# Altium footprint library pinghengche.PcbLib: 128 footprints (part 1 of 8)
Each footprint in its own frame and in the unit in brackets; x right, y up, seen from the top. Pads: shape width x height; smd on the part's side, far side on the other; paste and mask are expansions set on the pad; w line width, h text height; cw(c..) or ccw(c..) is an arc to the next point about the centre after c.
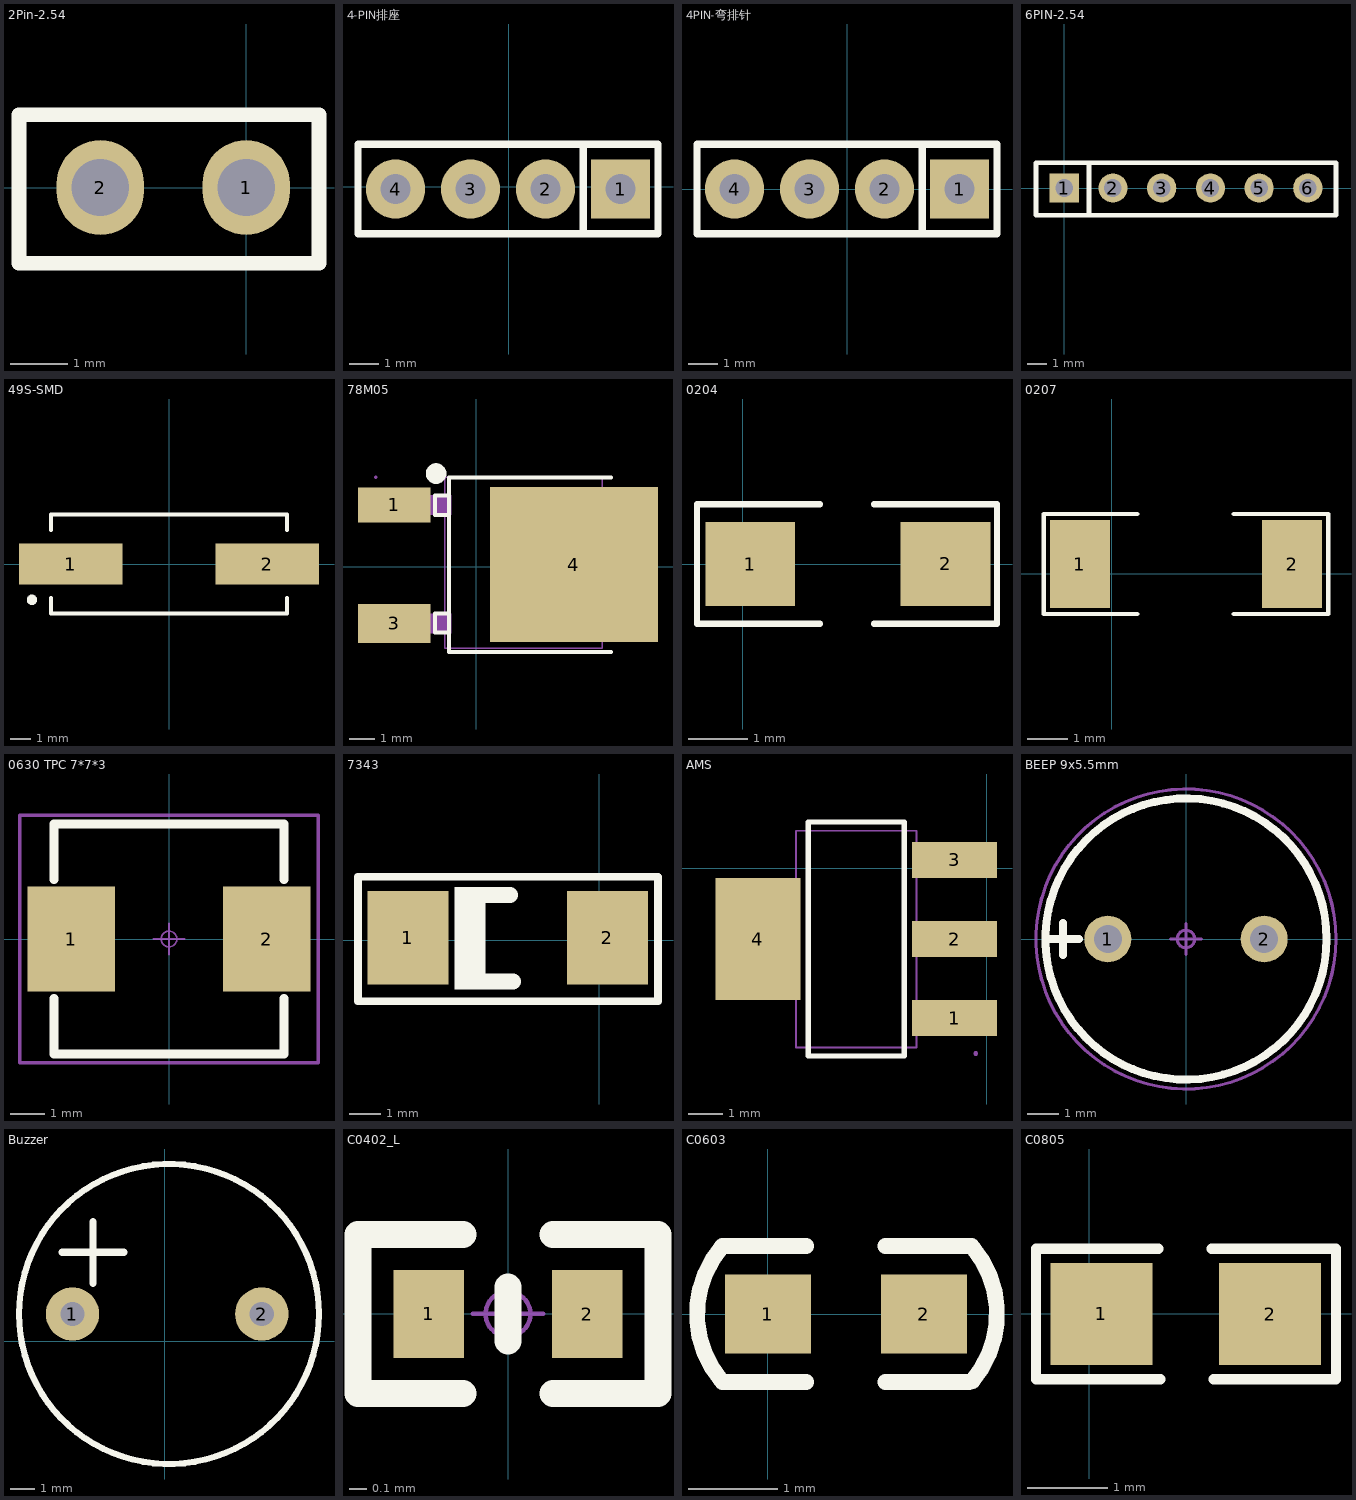
[diagram p0: the footprints below, top view; thin cyan lines are the x and y axes]

## 2Pin-2.54 [mil]
pads (2):
  oval 60x65 hole 39.37: 1(0,0) 2(-100.1,0)
Top Overlay:
  lines w10: -156,-52 50,-52 50,50 -156,50 -156,-52
3D body "1001-2.STEP": height 336.22, standoff -118.11, extent -153,-51 47,49

## 4-PIN排座 [mm]
pads (4):
  rect 2x2 hole 1: 1(3.785,-0.076)
  round 2 hole 1: 2(1.245,-0.076) 3(-1.295,-0.076) 4(-3.835,-0.076)
Top Overlay:
  lines w0.254: 2.515,-1.6 2.515,1.448 ; -5.105,-1.6 -5.105,1.448 5.055,1.448 5.055,-1.6 -5.105,-1.6
3D body "User Library-RM254_4pin.STEP": height 6.02, standoff -3.1, extent -5.131,-1.346 5.029,1.194

## 4PIN-弯排针 [mm] "弯排针"
pads (4):
  rect 2x2 hole 1: 1(3.81,0)
  round 2 hole 1: 2(1.27,0) 3(-1.27,0) 4(-3.81,0)
Top Overlay:
  lines w0.254: 2.54,-1.524 2.54,1.524 ; -5.08,-1.524 -5.08,1.524 5.08,1.524 5.08,-1.524 -5.08,-1.524
3D body "User Library-header90-4.STEP": height 3.04, standoff -2.5, extent -5.029,-10.004 5.131,0.356

## 6PIN-2.54 [mm]
pads (6):
  rect 1.5x1.5 hole 0.9: 1(0,0)
  round 1.5 hole 0.9: 2(2.5,0) 3(5,0) 4(7.5,0) 5(10,0) 6(12.5,0)
Top Overlay:
  lines w0.254: 1.27,-1.346 1.27,1.245 ; -1.448,-1.397 13.945,-1.397 13.945,1.295 -1.448,1.295 -1.448,-1.397
3D body "1001-6.STEP": height 8.54, standoff -3, extent -1.372,-1.27 13.868,1.27

## 49S-SMD [mm]
pads (2):
  rect 5x2 smd: 1(-4.75,0) 2(4.75,0)
Top Overlay:
  circle w0.25: c-6.625,-1.73 r0.125
  lines w0.2: -5.7,-1.65 -5.7,-2.4 5.7,-2.4 5.7,-1.65 ; -5.7,1.65 -5.7,2.4 5.7,2.4 5.7,1.65
3D body "User Library-hc49_cystal.STEP": height 4, standoff 0, extent -6.7,-2.462 6.7,2.438

## 78M05 [mm]
pads (3):
  rect 2.799x1.351 smd mask+0.051: 1(-3.172,2.383)
  rect 2.799x1.501 smd mask+0.051: 3(-3.172,-2.2)
  rect 6.5x5.999 smd mask+0.051: 4(3.777,0.074)
Top Overlay:
  lines w0.152: -1.046,-2.543 -1.046,-2.553 -1.603,-2.553 -1.603,-1.811 -1.046,-1.811 ; -1.046,2.007 -1.046,1.996 -1.603,1.996 -1.603,2.738 -1.046,2.738 ; 5.204,-3.302 -1.046,-3.302 -1.046,3.449 5.204,3.449
  lines w0.399: -1.555,3.393 cw(c-1.553,3.593) -1.552,3.393
Mechanical 6:
  circle w0.5: c-3.863,2.377 r0.249
Mechanical 15:
  region: -3.825,3.449 -3.825,3.475 -3.861,3.51 -3.911,3.51 -3.947,3.475 -3.947,3.449 -3.947,3.424 -3.911,3.388 -3.861,3.388 -3.825,3.424
  region: -2.344,-2.578 -2.344,-1.819 -0.96,-1.819 -0.96,-2.578
  region: -2.344,2.002 -2.344,2.761 -0.96,2.761 -0.96,2.002
  region: -3.886,2.002 -3.886,2.761 -2.337,2.761 -2.337,2.002
  region: -3.886,-2.578 -3.886,-1.819 -2.337,-1.819 -2.337,-2.578
  region: 0.864,-2.565 0.864,2.715 5.687,2.715 6.215,2.187 6.215,-2.037 5.687,-2.565
  lines w0.051: -1.222,-3.152 -1.222,3.449 4.879,3.449 4.879,-3.152 -1.222,-3.152

## 0204 [mm]
height 0.6
pads (2):
  rect 1.5x1.4 smd: 1(0.127,0) 2(3.4,0)
Top Overlay:
  lines w0.102: 1.3,-1 -0.762,-1 -0.762,1 1.3,1 ; 2.2,-1 4.262,-1 4.262,1 2.2,1
3D body "Melf_0204.STEP": height 1.4, standoff 0, extent 0.078,-0.711 3.478,0.689

## 0207 [mm]
height 0.6
pads (2):
  rect 1.5x2.2 smd: 1(-0.796,0.246) 2(4.504,0.246)
Top Overlay:
  lines w0.102: 0.635,-1 -1.702,-1 -1.702,1.499 0.635,1.499 ; 3.048,-1 5.41,-1 5.41,1.499 3.048,1.499
3D body "R0207.STEP": height 2.2, standoff 0, extent -0.796,-0.854 4.504,1.346

## 0630 TPC 7*7*3 [mm]
height 2
pads (2):
  rect 2.5x3 smd: 1(-2.8,0) 2(2.8,0)
Top Overlay:
  lines w0.254: -3.3,-1.7 -3.3,-3.3 3.3,-3.3 3.3,-1.7 ; -3.3,1.7 -3.3,3.3 3.3,3.3 3.3,1.7
Top Component Center:
  circle w0.05: c0,0 r0.225
  lines w0.05: -0.45,0 0.45,0 ; 0,-0.45 0,0.45
Top Component Outline:
  lines w0.1: -4.275,-3.55 -4.275,3.55 4.275,3.55 4.275,-3.55 -4.275,-3.55
Top Designator:
  text ".Designator" at -2.252,-0.226 h1
3D body: height 3, standoff 0, extent -3.3,-3.3 3.3,3.3

## 7343 [mm] "钽电容"
pads (2):
  rect 2.6x3 smd: 1(-6.148,0.083) 2(0.252,0.083)
Top Overlay:
  rectangle: -4.648,-1.575 -3.658,1.702
  lines w0.254: -7.747,-1.956 -7.747,2.038 1.88,2.031 1.88,-1.956 -7.747,-1.956
  lines w0.508: -3.988,1.448 -2.87,1.448 ; -3.886,-1.321 -2.769,-1.321
3D body "User Library-CaseV_7343-20.STEP": height 2, standoff 0, extent -6.622,-2.108 0.678,2.192

## AMS [mil]
pads (4):
  rect 97x41.3 smd mask+2: 1(-36.5,-171.6) 2(-36.5,-81.1) 3(-36.5,9.5)
  rect 97x139.4 smd mask+2: 4(-261.5,-81.1)
Top Overlay:
  lines w6: -204,-215 -204,52.8 -94,52.8 -94,-215 -204,-215
Mechanical 6:
  circle w15.7: c-14,-171.1 r7.9
Mechanical 15:
  region: -9.8,-212 -9.8,-211.01 -11.21,-209.6 -13.19,-209.6 -14.6,-211.01 -14.6,-212 -14.6,-212.99 -13.19,-214.4 -11.21,-214.4 -9.8,-212.99
  region: -258.6,-140.2 -258.6,-22 -217.5,-22 -217.5,-140.2
  region: -285.8,-140.2 -285.8,-22 -258.3,-22 -258.3,-140.2
  region: -80.5,-5.1 -80.5,24 -52.1,24 -52.1,-5.1
  region: -52.5,-5.1 -52.5,24 -12.2,24 -12.2,-5.1
  region: -80.5,-95.7 -80.5,-66.5 -52.1,-66.5 -52.1,-95.7
  region: -52.5,-95.7 -52.5,-66.5 -12.2,-66.5 -12.2,-95.7
  region: -80.5,-186.2 -80.5,-157.1 -52.1,-157.1 -52.1,-186.2
  region: -52.5,-186.2 -52.5,-157.1 -12.2,-157.1 -12.2,-186.2
  lines w2: -217.9,-205.1 -80.1,-205.1 -80.1,42.9 -217.9,42.9 -217.9,-205.1

## BEEP 9x5.5mm [mm]
height 2
pads (2):
  round 1.5 hole 0.9: 1(-2.5,0) 2(2.5,0)
Top Overlay:
  circle w0.254: c0,0 r4.5
  lines w0.254: -4.496,0 -3.429,0 ; -3.937,-0.508 -3.937,0.508
Top Component Center:
  circle w0.1: c0,0 r0.28
  lines w0.1: -0.5,0 0.5,0 ; 0,-0.5 0,0.5
Top Component Outline:
  circle w0.1: c0,0 r4.8
Top Designator:
  text ".Designator" at -2.252,-0.226 h1
3D body "cx-0905c.stp": height 5.05, standoff -5.45, extent -4.8,-4.8 4.8,4.8

## Buzzer [mm]
pads (2):
  round 2.2 hole 1: 1(-3.81,1.118) 2(3.99,1.118)
Top Overlay:
  circle w0.254: c0.166,1.118 r6.18
  lines w0.305: -4.236,3.658 -1.696,3.658 ; -2.966,2.388 -2.966,4.928
3D body "User Library-FM 12mm 300mil.STEP": height 9.3, standoff -3.5, extent -5.842,-4.978 6.158,7.022

## C0402_L [mm] "贴片MLCC电容"
pads (2):
  rect 0.4x0.5 smd: 1(-0.45,0) 2(0.45,0)
Top Overlay:
  lines w0.152: -0.254,-0.45 -0.85,-0.45 ; -0.254,0.45 -0.85,0.45 -0.85,-0.45 ; 0,-0.152 0,0.152 ; 0.254,-0.45 0.85,-0.45 0.85,0.45 0.254,0.45 ; -0.85,-0.45 -0.85,-0.45
Mechanical 15:
  circle w0.025: c0,0 r0.127
  lines w0.025: -0.2,0 0.2,0 ; 0,-0.2 0,0.2
3D body "C 0402.STEP": height 0.54, standoff 0.02, extent -0.5,-0.26 0.5,0.26

## C0603 [mil]
pads (2):
  rect 38x35 smd: 1(0,0) 2(69,0)
Top Overlay:
  lines w7: -21,-29 cw(c14.45,-0.04) -20.48,29.56 ; -20,-30 17,-30 ; -20,30 17,30 ; 52,-30 89,-30 ; 52,30 90,30 ; 90.48,-29.56 ccw(c55.55,0.04) 91,29
3D body "User Library-0603 SMD Capacitor.STEP": height 11.89, standoff 0, extent 3.8,-15.8 66.8,15.7

## C0805 [mil]
pads (2):
  rect 50x50 smd: 1(6,0) 2(88.7,-0.1)
Top Overlay:
  lines w5: 34,32 -26,32 -26,-15 -26,-32 35,-32 ; 60,32 121,32 121,15 121,-32 61,-32
3D body "User Library-0805 SMD Capacitor.STEP": height 30.39, standoff -0.39, extent 7.93,-24.5 86.67,24.71